# Altium footprint library misc.PcbLib: 40 footprints (part 3 of 3)
Each footprint in its own frame and in the unit in brackets; x right, y up, seen from the top. Pads: shape width x height; smd on the part's side, far side on the other; paste and mask are expansions set on the pad; w line width, h text height; cw(c..) or ccw(c..) is an arc to the next point about the centre after c.
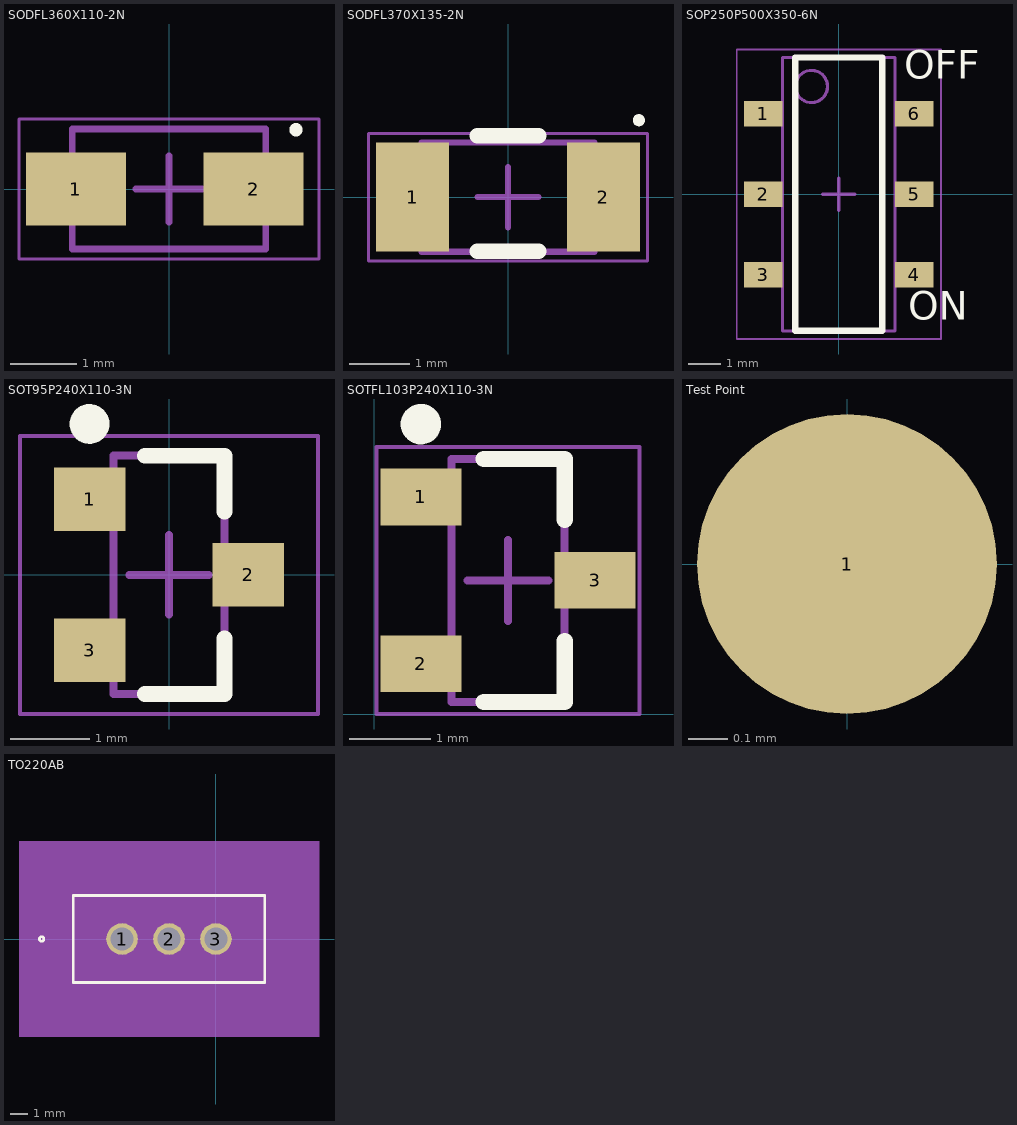
[diagram p2: the footprints below, top view; thin cyan lines are the x and y axes]

## SODFL360X110-2N [mm] "SODFL, 2-Leads, Body 1.65x3.60mm, IPC Medium Density"
height 1.1
pads (2):
  rect 1.5x1.1 smd: 1(-1.397,0) 2(1.27,0)
Top Overlay:
  circle w0.1: c1.905,0.889 r0.05
Mechanical 13:
  lines w0.1: -1.45,-0.9 1.45,-0.9 1.45,0.9 -1.45,0.9 -1.45,-0.9
Mechanical 15:
  lines w0.05: -2.25,-1.05 2.25,-1.05 2.25,1.05 -2.25,1.05 -2.25,-1.05
  lines w0.1: -0.5,0 0.5,0 ; 0,-0.5 0,0.5
3D body "SODFL360X110-2N.step": height 1.1, standoff 0, extent -1.8,-0.9 1.8,0.9

## SODFL370X135-2N [mm] "SODFL, 2-Leads, Body 1.60x3.70mm, IPC Medium Density"
height 1.35
pads (2):
  rect 1.2x1.8 smd: 1(-1.575,0) 2(1.575,0)
Top Overlay:
  circle w0.1: c2.159,1.27 r0.05
  lines w0.254: -0.508,-0.889 0.508,-0.889 ; -0.508,1.016 0.508,1.016
Mechanical 13:
  lines w0.1: -1.425,-0.9 1.425,-0.9 1.425,0.9 -1.425,0.9 -1.425,-0.9
Mechanical 15:
  lines w0.05: -2.3,-1.05 2.3,-1.05 2.3,1.05 -2.3,1.05 -2.3,-1.05
  lines w0.1: -0.5,0 0.5,0 ; 0,-0.5 0,0.5
3D body: height 1.35, standoff 0, extent -1.425,-0.9 1.425,0.9

## SOP250P500X350-6N [mm] "SOP, 6-Leads, Body 8.50x3.50mm, Pitch 2.50mm, IPC Medium Density"
height 3.5
pads (6):
  rect 1.2x0.8 smd: 1(-2.35,2.5) 2(-2.35,0) 3(-2.35,-2.5) 4(2.35,-2.5) 5(2.35,0) 6(2.35,2.5)
Top Overlay:
  lines w0.2: -1.35,-4.25 1.35,-4.25 1.35,4.25 -1.35,4.25 -1.35,-4.25
  text "OFF" at 2.032,3.302 h1.52
  text "ON" at 2.159,-4.191 h1.52
Mechanical 13:
  circle w0.1: c-0.85,3.35 r0.5
  lines w0.1: -1.75,-4.25 1.75,-4.25 1.75,4.25 -1.75,4.25 -1.75,-4.25
Mechanical 15:
  lines w0.05: -3.175,-4.5 3.175,-4.5 3.175,4.5 -3.175,4.5 -3.175,-4.5
  lines w0.1: -0.5,0 0.5,0 ; 0,-0.5 0,0.5
3D body "CL-SB-22B-01T.stp": height 5.5, standoff 0, extent -2.5,-4.25 2.5,4.25

## SOT95P240X110-3N [mm] "SOT23, 3-Leads, Body 2.90x2.40mm, Pitch 0.95mm, IPC Medium Density"
height 1.1
pads (3):
  rect 0.9x0.8 smd: 1(-1,0.95) 2(1,0) 3(-1,-0.95)
Top Overlay:
  circle w0.25: c-1,1.9 r0.125
  lines w0.2: -0.3,-1.5 0.7,-1.5 0.7,-0.8 ; -0.3,1.5 0.7,1.5 0.7,0.8
Mechanical 13:
  lines w0.1: -0.7,-1.5 0.7,-1.5 0.7,1.5 -0.7,1.5 -0.7,-1.5
Mechanical 15:
  lines w0.05: -1.875,-1.75 1.875,-1.75 1.875,1.75 -1.875,1.75 -1.875,-1.75
  lines w0.1: -0.5,0 0.5,0 ; 0,-0.5 0,0.5
3D body: height 1.1, standoff 0.05, extent -0.7,-1.5 0.7,1.5

## SOTFL103P240X110-3N [mm]
pads (3):
  rect 1x0.7 smd: 1(0.576,2.681) 2(0.576,0.621) 3(2.726,1.651)
Top Overlay:
  circle w0.25: c0.576,3.581 r0.125
  lines w0.2: 1.351,0.151 2.351,0.151 2.351,0.901 ; 1.351,3.151 2.351,3.151 2.351,2.401
Mechanical 13:
  lines w0.1: 0.951,0.151 0.951,3.151 2.351,3.151 2.351,0.151 0.951,0.151
Mechanical 15:
  lines w0.05: 0.026,0.001 0.026,3.301 3.276,3.301 3.276,0.001 0.026,0.001
  lines w0.1: 1.151,1.651 2.151,1.651 ; 1.651,1.151 1.651,2.151
3D body "SOTFL103P240X110-3N.step": height 1.1, standoff 0, extent 0.451,0.153 2.851,3.149

## STL90N6F7 [mm]

## Test Point [mil] "SMD Test Point"
pads (1):
  round 30 smd: 1(0,0)

## TO220AB [mil]
pads (3):
  round 70 hole 50: 1(-207.87,0) 2(-103.94,0) 3(0,0)
Top Overlay:
  circle w6: c-385.94,0 r5
  lines w6: -315.94,-96.5 108.06,-96.5 108.06,96.5 -315.94,96.5 -315.94,-96.5
Mechanical 5:
  region: -435.94,216.5 228.06,216.5 228.06,-216.5 -435.94,-216.5
Mechanical 15:
  region: 113.06,101.5 -320.94,101.5 -320.94,-101.5 113.06,-101.5
  lines w6: -320.94,-101.5 -320.94,101.5 113.06,101.5 113.06,-101.5 -320.94,-101.5
3D body: height 10, standoff 0, extent 0,0 10,10